# Altium footprint library EwgPassive.pcblib: 60 footprints (part 2 of 4)
Each footprint in its own frame and in the unit in brackets; x right, y up, seen from the top. Pads: shape width x height; smd on the part's side, far side on the other; paste and mask are expansions set on the pad; w line width, h text height; cw(c..) or ccw(c..) is an arc to the next point about the centre after c.
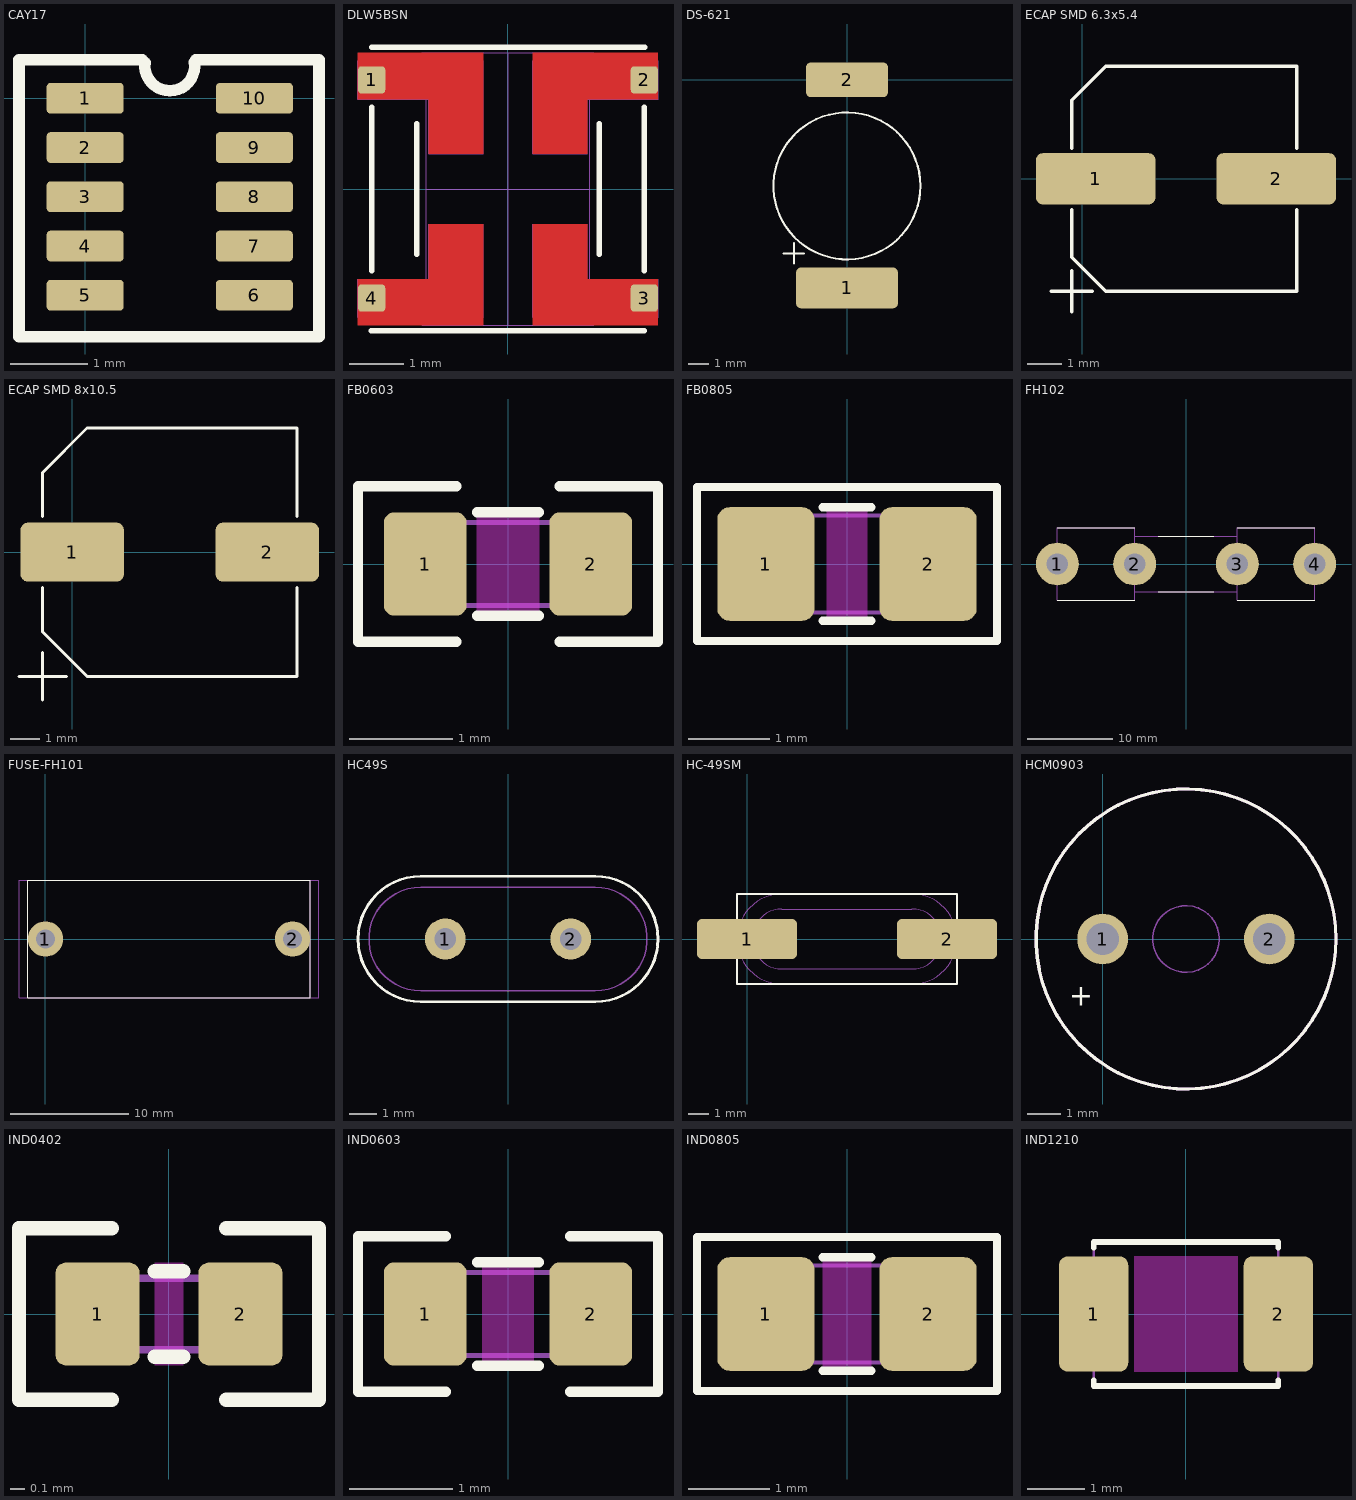
[diagram p1: the footprints below, top view; thin cyan lines are the x and y axes]

## CAY17 [mm]
pads (10):
  rrect25% 1x0.4 smd: 1(0,0) 2(0,-0.64) 3(0,-1.28) 4(0,-1.92) 5(0,-2.56) 6(2.2,-2.56) 7(2.2,-1.92) 8(2.2,-1.28) 9(2.2,-0.64) 10(2.2,0)
Top Overlay:
  lines w0.15: 0.74,0.5 -0.86,0.5 -0.86,-3.1 3.04,-3.1 3.04,0.5 1.44,0.5 ; 0.781,0.465 ccw(c1.1,0.42) 1.419,0.467

## DLW5BSN [mm]
height 5
pads (4):
  rrect25% 0.5x0.5 smd: 1(-2.5,2) 2(2.5,2) 3(2.5,-2) 4(-2.5,-2)
Top Layer:
  region: -2.75,-1.65 -1.45,-1.65 -1.45,-0.65 -0.45,-0.65 -0.45,-2.5 -2.75,-2.5
  region: 2.75,-1.65 1.45,-1.65 1.45,-0.65 0.45,-0.65 0.45,-2.5 2.75,-2.5
  region: 2.75,1.65 1.45,1.65 1.45,0.65 0.45,0.65 0.45,2.5 2.75,2.5
  region: -2.75,1.65 -1.45,1.65 -1.45,0.65 -0.45,0.65 -0.45,2.5 -2.75,2.5
Top Overlay:
  lines w0.1: -2.504,-2.6 2.5,-2.6 ; -2.5,-1.5 -2.5,0 -2.5,1.5 ; -2.5,2.6 2.504,2.6 ; -1.674,-1.2 -1.674,0 -1.674,1.2 ; 1.674,-1.2 1.674,0 1.674,1.2 ; 2.5,-1.5 2.5,-0.8 2.5,1.5
Mechanical 1:
  lines w0.02: -1.5,0 0,0 ; -1.5,0 -1.5,-1.8 -1.574,-1.8 -1.574,-2.5 0,-2.5 ; -1.5,0 -1.5,1.8 -1.574,1.8 -1.574,2.5 0,2.5 ; 0,-2.5 0,0 ; 0,-2.5 1.574,-2.5 1.574,-1.8 1.5,-1.8 1.5,0 ; 0,0 0,2.5 ; 0,0 1.5,0 ; 0,2.5 1.574,2.5 1.574,1.8 1.5,1.8 1.5,0 ; -2.75,-2.35 -0.45,-2.35 -0.45,-0.65 -1.45,-0.65 -1.45,-1.65 -2.75,-1.65 -2.75,-2.35 ; -2.75,1.65 -2.75,2.35 -0.45,2.35 -0.45,0.65 -1.45,0.65 -1.45,1.65 -2.75,1.65 ; 0.45,-2.35 2.75,-2.35 2.75,-1.65 1.45,-1.65 1.45,-0.65 0.45,-0.65 0.45,-2.35 ; 0.45,0.65 0.45,2.35 2.75,2.35 2.75,1.65 1.45,1.65 1.45,0.65 0.45,0.65
3D body: height 4.47, standoff 0, extent -2.5,-2.5 2.5,2.5

## DS-621 [mm] "Ионистор"
pads (2):
  rrect25% 5x2 smd: 1(0,-10.2)
  rrect25% 4x1.7 smd: 2(0,0)
Top Overlay:
  circle w0.1: c0,-5.2 r3.6
  lines w0.1: -3.1,-8.5 -2.1,-8.5 ; -2.6,-9 -2.6,-8
3D body: height 2.8, standoff 0, extent -3.4,-11.05 3.4,0.65

## ECAP SMD 6.3x5.4 [mm]
pads (2):
  rrect25% 3.5x1.5 smd: 1(0.4,0) 2(5.7,0)
Top Overlay:
  lines w0.1: -0.9,-3.3 -0.3,-3.3 ; -0.3,-3.9 -0.3,-3.3 ; -0.3,-2.7 -0.3,-3.3 ; -0.3,-0.9 -0.3,-2.3 0.7,-3.3 6.3,-3.3 6.3,-0.9 ; -0.3,0.9 -0.3,2.3 0.7,3.3 6.3,3.3 6.3,0.9 ; 0.3,-3.3 -0.3,-3.3
3D body: height 6.5, standoff 0, extent -0.5,-3.3 6.5,3.3

## ECAP SMD 8x10.5 [mm]
pads (2):
  rrect25% 3.5x2 smd: 1(0,0) 2(6.6,0)
Top Overlay:
  lines w0.1: -1.8,-4.2 -1,-4.2 ; -1,-5 -1,-4.2 ; -1,-3.4 -1,-4.2 ; -1,-1.2 -1,-2.7 0.5,-4.2 7.6,-4.2 7.6,-1.2 ; -1,1.2 -1,2.7 0.5,4.2 7.6,4.2 7.6,1.2 ; -0.2,-4.2 -1,-4.2
3D body: height 10.6, standoff 0, extent -1.25,-4.15 7.85,4.15

## FB0603 [mm]
pads (2):
  rrect25% 0.8x1 smd: 1(-0.8,0) 2(0.8,0)
Top Layer keep-out:
  region: -0.3,0.5 -0.3,-0.5 0.3,-0.5 0.3,0.5
Top Overlay:
  lines w0.1: -0.5,-0.75 -1.45,-0.75 -1.45,0.75 -0.5,0.75 ; -0.3,-0.5 0.3,-0.5 ; -0.3,0.5 0.3,0.5 ; 0.5,-0.75 1.45,-0.75 1.45,0.75 0.5,0.75
Mechanical 1:
  lines w0.05: -0.5,-0.4 -0.5,0.4 ; 0.5,-0.4 0.5,0.4 ; -0.8,-0.4 0.8,-0.4 0.8,0.4 -0.8,0.4 -0.8,-0.4
3D body: height 0.65, standoff 0, extent -0.8,-0.4 0.8,0.4

## FB0805 [mm]
pads (2):
  rrect25% 1.2x1.4 smd: 1(-1,0) 2(1,0)
Top Layer keep-out:
  region: -0.25,-0.7 0.25,-0.7 0.25,0.7 -0.25,0.7
Top Overlay:
  lines w0.1: -0.3,-0.7 0.3,-0.7 ; -0.3,0.7 0.3,0.7 ; -1.85,-0.95 1.85,-0.95 1.85,0.95 -1.85,0.95 -1.85,-0.95
Mechanical 1:
  lines w0.05: -0.5,-0.6 -0.5,0.6 ; 0.5,-0.6 0.5,0.6 ; -1,-0.6 -1,0.6 1,0.6 1,-0.6 -1,-0.6
3D body: height 1, standoff 0, extent -1,-0.625 1,0.625

## FH102 [mm]
pads (4):
  round 5 hole 2.5: 1(-15,0) 2(-6,0) 3(6,0) 4(15,0)
Top Overlay:
  lines w0.1: -15,-4.25 -6,-4.25 ; -15,4.25 -6,4.25 ; -3.25,-3.25 3.25,-3.25 ; -3.25,3.25 3.25,3.25 ; 6,-4.25 15,-4.25 ; 6,4.25 15,4.25
Mechanical 1:
  lines w0.05: 6,-3.25 -6,-3.25 -6,3.25 6,3.25 6,0 ; -15,-4.25 -6,-4.25 -6,4.25 -15,4.25 -15,0 -15,-4.25 ; 6,-4.25 14.75,-4.25 15,-4.25 15,4.25 6,4.25 6,-4.25
3D body: height 9.5, standoff -3, extent -15.425,-3.76 15.575,3.563

## FUSE-FH101 [mm]
pads (2):
  round 3 hole 1.6: 1(0,0) 2(21,0)
Top Overlay:
  lines w0.1: -1.5,-5 22.5,-5 22.5,5 -1.5,5 -1.5,-5
Mechanical 1:
  lines w0.05: -1.5,-5 22.5,-5 ; -1.5,-5 -1.5,5 ; -1.5,-5 -2.25,-5 -2.25,5 -1.5,5 ; -1.5,5 22.5,5 ; 22.5,-5 22.5,5 ; 22.5,-5 23.25,-5 23.25,5 22.5,5
3D body: height 13.7, standoff -3, extent -2.7,-4.9 23.8,4.9

## HC49S [mm]
pads (2):
  round 1.5 hole 0.8: 1(-2.3,0) 2(2.3,0)
Top Overlay:
  lines w0.1: -3.2,-2.3 cw(c-3.2,0) -3.2,2.3 3.2,2.3 cw(c3.2,0) 3.2,-2.3 -3.2,-2.3
Mechanical 1:
  lines w0.05: -5.5,0 ccw(c-3.2,0) -3.2,-2.3 0,-2.3 3.2,-2.3 ccw(c3.2,0) 5.5,0 ccw(c3.2,0) 3.2,2.3 0,2.3 -3.2,2.3 ccw(c-3.2,0) -5.5,0 ; -3.2,-1.9 cw(c-3.2,0) -3.2,1.9 3.2,1.9 cw(c3.2,0) 3.2,-1.9 -3.2,-1.9
  text "HC49S" at -1.6,-0.7 h0.63
3D body: height 4.25, standoff -3, extent -5.5,-2.3 5.5,2.35

## HC-49SM [mm]
pads (2):
  rrect25% 5x2 smd: 1(0,0) 2(10,0)
Top Overlay:
  lines w0.1: -0.5,-2.25 -0.5,2.25 10.5,2.25 10.5,-2.25 -0.5,-2.25
Mechanical 1:
  lines w0.05: -0.5,-0.375 -2,-0.375 -2,0.375 -0.5,0.375 ; 1.75,-2.25 cw(c1.75,0) 1.75,2.25 ; 8.25,-2.25 ccw(c8.25,0) 8.25,2.25 ; 10.5,-0.375 12,-0.375 12,0.375 10.5,0.375 ; -0.5,-2.25 -0.5,2.25 ; -0.5,-2.25 -0.5,2.25 ; -0.5,-2.25 10.5,-2.25 10.5,2.25 ; -0.5,2.25 10.5,2.25 ; -0.5,2.25 10.5,2.25 ; 1.75,-1.5 cw(c1.75,0) 1.75,1.5 8.25,1.5 cw(c8.25,0) 8.25,-1.5 1.75,-1.5
3D body: height 5.1, standoff 0, extent -1.125,-2.25 11.175,2.25

## HCM0903 [mil]
pads (2):
  round 60 hole 38: 1(0,0) 2(196.85,0)
Top Overlay:
  circle w3.94: c98.43,0 r177.17
  text "+" at -39.37,-78.74 h24.61
Mechanical 1:
  circle w1.97: c98.43,0 r39.37
  circle w3.94: c98.43,0 r177.17
3D body: height 216.54, standoff -78.74, extent -78.74,-177.17 275.59,177.16

## IND0402 [mm]
pads (2):
  rrect25% 0.59x0.72 smd: 1(-0.5,0) 2(0.5,0)
Top Layer keep-out:
  region: -0.1,0.36 -0.1,-0.36 0.1,-0.36 0.1,0.36
Top Overlay:
  lines w0.1: -0.4,-0.6 -1.05,-0.6 -1.05,0.6 -0.4,0.6 ; -0.1,-0.3 0.1,-0.3 ; -0.1,0.3 0.1,0.3 ; 0.4,-0.6 1.05,-0.6 1.05,0.6 0.4,0.6
Mechanical 1:
  lines w0.05: -0.3,0.25 -0.3,-0.25 -0.5,-0.25 ; 0.3,-0.25 0.3,0.25 ; -0.5,-0.25 -0.5,0.25 0.5,0.25 0.5,-0.25 -0.5,-0.25
3D body: height 0.6, standoff 0, extent -0.5,-0.25 0.5,0.25

## IND0603 [mm]
pads (2):
  rrect25% 0.8x1 smd: 1(-0.8,0) 2(0.8,0)
Top Layer keep-out:
  region: -0.25,0.5 -0.25,-0.5 0.25,-0.5 0.25,0.5
Top Overlay:
  lines w0.1: -0.6,-0.75 -1.45,-0.75 -1.45,0.75 -0.6,0.75 ; -0.3,-0.5 0.3,-0.5 ; -0.3,0.5 0.3,0.5 ; 0.6,-0.75 1.45,-0.75 1.45,0.75 0.6,0.75
Mechanical 1:
  lines w0.05: -0.5,-0.4 -0.5,0.4 ; 0.5,-0.4 0.5,0.4 ; -0.8,-0.4 -0.8,0.4 0.8,0.4 0.8,-0.4 -0.8,-0.4
3D body: height 0.8, standoff 0, extent -0.8,-0.475 0.8,0.475

## IND0805 [mm]
pads (2):
  rrect25% 1.2x1.4 smd: 1(-1,0) 2(1,0)
Top Layer keep-out:
  region: -0.3,-0.7 0.3,-0.7 0.3,0.7 -0.3,0.7
Top Overlay:
  lines w0.1: -0.3,-0.7 0.3,-0.7 ; -0.3,0.7 0.3,0.7 ; -1.85,-0.95 -1.85,0.95 1.85,0.95 1.85,-0.95 -1.85,-0.95
Mechanical 1:
  lines w0.05: -0.5,-0.6 -0.5,0.6 ; 0.5,-0.6 0.5,0.6 ; -1,-0.6 1,-0.6 1,0.6 -1,0.6 -1,-0.6
3D body: height 1, standoff 0, extent -1,-0.625 1,0.625

## IND1210 [mm]
pads (2):
  rrect25% 1.2x2 smd: 1(-1.6,0) 2(1.6,0)
Top Layer keep-out:
  region: -0.9,-1 0.9,-1 0.9,1 -0.9,1
Top Overlay:
  lines w0.1: -1.6,-1.15 -1.6,-1.25 1.6,-1.25 1.6,-1.15 ; -1.6,1.15 -1.6,1.25 1.6,1.25 1.6,1.15
Mechanical 1:
  lines w0.05: 1.6,-0.8 1.6,0.8 ; -1.6,-1.25 1.6,-1.25 1.6,1.25 -1.6,1.25 -1.6,-1.25
3D body: height 2.21, standoff 0, extent -1.6,-1.2 1.575,1.281